# Altium footprint library IC.PcbLib: 54 footprints (part 1 of 4)
Each footprint in its own frame and in the unit in brackets; x right, y up, seen from the top. Pads: shape width x height; smd on the part's side, far side on the other; paste and mask are expansions set on the pad; w line width, h text height; cw(c..) or ccw(c..) is an arc to the next point about the centre after c.
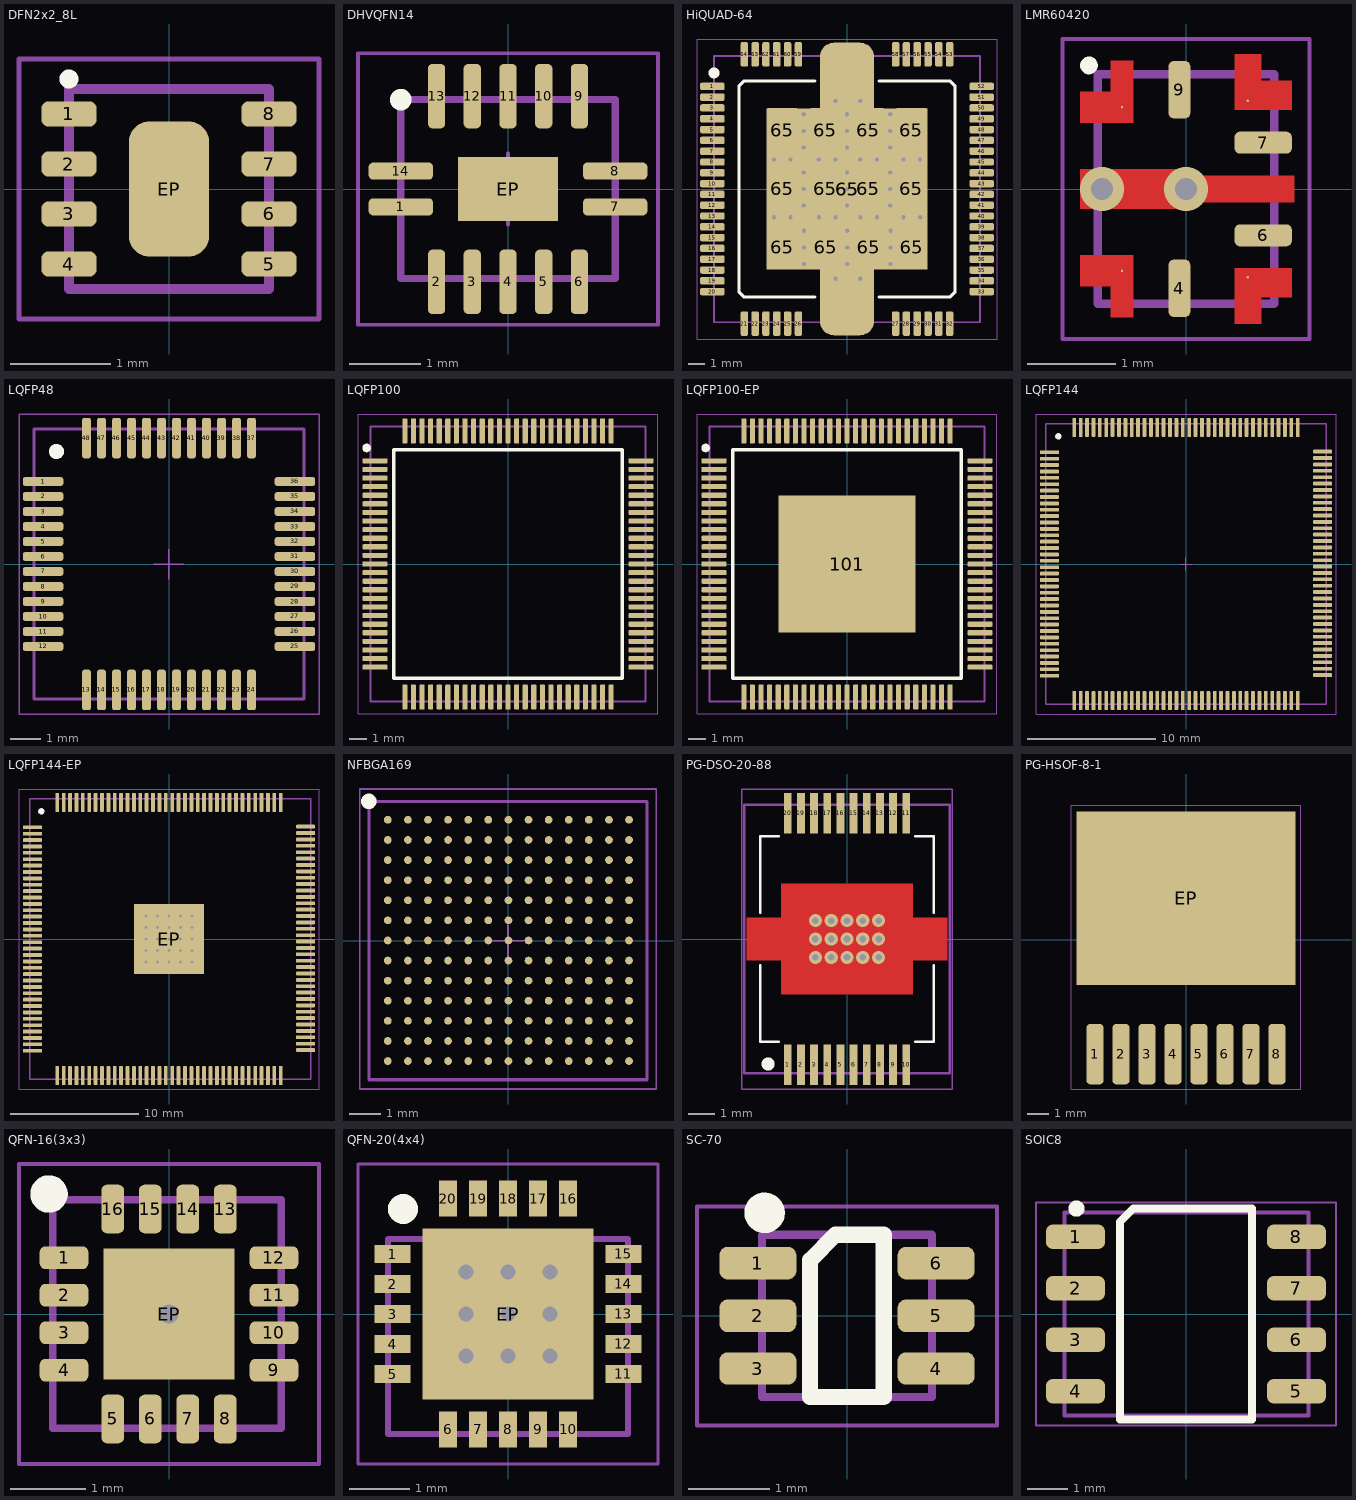
[diagram p0: the footprints below, top view; thin cyan lines are the x and y axes]

## DFN2x2_8L [mm] "2x2mm"
height 0.8
pads (9):
  rrect50% 0.55x0.25 smd: 1(-1,0.75) 2(-1,0.25) 3(-1,-0.25) 4(-1,-0.75) 5(1,-0.75) 6(1,-0.25) 7(1,0.25) 8(1,0.75)
  rrect50% 0.8x1.35 smd: EP(0,0)
Top Overlay:
  circle w0.15: c-1,1.1 r0.02
Mechanical 13:
  lines w0.1: -1,-1 1,-1 1,1 -1,1 -1,-1
Mechanical 15:
  lines w0.05: -1.5,-1.3 1.5,-1.3 1.5,1.3 -1.5,1.3 -1.5,-1.3
3D body "DFN8_2x2.STEP": height 0.75, standoff 0, extent -1.005,-1 1.005,1

## DHVQFN14 [mm] "plastic, leadless dual in-line compatible thermal enhanced / very thin quad flat package; 14 terminals; 0.5 mm pitch; 2.5x3x1 mm body"
height 1
pads (15):
  rrect50% 0.9x0.24 smd: 1(-1.5,-0.25) 7(1.5,-0.25) 8(1.5,0.25) 14(-1.5,0.25)
  rrect50% 0.24x0.9 smd: 2(-1,-1.3) 3(-0.5,-1.3) 4(0,-1.3) 5(0.5,-1.3) 6(1,-1.3) 9(1,1.3) 10(0.5,1.3) 11(0,1.3) 12(-0.5,1.3) 13(-1,1.3)
  rect 1.4x0.9 smd paste-2539.97: EP(0,0)
Top Overlay:
  circle w0.2: c-1.501,1.251 r0.05
Top Paste:
  rectangle: -0.3,-0.2 0.3,0.2
Mechanical 13:
  lines w0.1: -1.501,-1.251 1.501,-1.251 1.501,1.251 -1.501,1.251 -1.501,-1.251
Mechanical 15:
  lines w0.05: -0.5,0 0.5,0 ; 0,-0.5 0,0.5 ; -2.1,-1.9 2.1,-1.9 2.1,1.9 -2.1,1.9 -2.1,-1.9
3D body "User Library-DHVQFN 14.STEP": height 0.85, standoff -0.02, extent -1.501,-1.251 1.501,1.251

## HiQUAD-64 [mm] "64-Pin HI-QUAD package"
height 2
pads (78):
  rrect50% 1.475x0.45 smd mask+0.05: 1(-8.1,6.175) 2(-8.1,5.525) 3(-8.1,4.875) 4(-8.1,4.225) 5(-8.1,3.575) 6(-8.1,2.925) 7(-8.1,2.275) 8(-8.1,1.625) 9(-8.1,0.975) 10(-8.1,0.325) 11(-8.1,-0.325) 12(-8.1,-0.975) 13(-8.1,-1.625) 14(-8.1,-2.275) 15(-8.1,-2.925) 16(-8.1,-3.575) 17(-8.1,-4.225) 18(-8.1,-4.875) 19(-8.1,-5.525) 20(-8.1,-6.175) 33(8.1,-6.175) 34(8.1,-5.525) 35(8.1,-4.875) 36(8.1,-4.225) 37(8.1,-3.575) 38(8.1,-2.925) 39(8.1,-2.275) 40(8.1,-1.625) 41(8.1,-0.975) 42(8.1,-0.325) 43(8.1,0.325) 44(8.1,0.975) 45(8.1,1.625) 46(8.1,2.275) 47(8.1,2.925) 48(8.1,3.575) 49(8.1,4.225) 50(8.1,4.875) 51(8.1,5.525) 52(8.1,6.175)
  rrect50% 0.45x1.475 smd mask+0.05: 21(-6.175,-8.1) 22(-5.525,-8.1) 23(-4.875,-8.1) 24(-4.225,-8.1) 25(-3.575,-8.1) 26(-2.925,-8.1) 27(2.925,-8.1) 28(3.575,-8.1) 29(4.225,-8.1) 30(4.875,-8.1) 31(5.525,-8.1) 32(6.175,-8.1) 53(6.175,8.1) 54(5.525,8.1) 55(4.875,8.1) 56(4.225,8.1) 57(3.575,8.1) 58(2.925,8.1) 59(-2.925,8.1) 60(-3.575,8.1) 61(-4.225,8.1) 62(-4.875,8.1) 63(-5.525,8.1) 64(-6.175,8.1)
  rect 1.8x2.7 smd paste-10: 65(-3.896,0.021) 65(-3.896,3.521) 65(-3.883,-3.493) 65(-1.304,0.021) 65(-1.304,3.521) 65(-1.291,-3.493) 65(1.287,0.021) 65(1.287,3.521) 65(1.301,-3.493) 65(3.879,0.021) 65(3.879,3.521) 65(3.892,-3.493)
  rect 9.7x9.7 smd paste-10 mask+0.102: 65(0,0)
  rrect50% 3.25x17.6 smd paste-10 mask+0.102: 65(0,0)
via 0,1 diameter 0.5 hole 0.25
via 0,-1 diameter 0.5 hole 0.25
via 0,3.5 diameter 0.5 hole 0.25
via 0,4.5 diameter 0.5 hole 0.25
via 0,2.5 diameter 0.5 hole 0.25
via 2.6,3.5 diameter 0.5 hole 0.25
via 2.6,4.5 diameter 0.5 hole 0.25
via 2.6,2.5 diameter 0.5 hole 0.25
via -2.6,3.5 diameter 0.5 hole 0.25
via -2.6,4.5 diameter 0.5 hole 0.25
via -2.6,2.5 diameter 0.5 hole 0.25
via -2.6,0 diameter 0.5 hole 0.25
via -2.6,1 diameter 0.5 hole 0.25
via -2.6,-1 diameter 0.5 hole 0.25
via 2.6,0 diameter 0.5 hole 0.25
via 2.6,1 diameter 0.5 hole 0.25
via 2.6,-1 diameter 0.5 hole 0.25
via 2.613,-3.514 diameter 0.5 hole 0.25
via 2.613,-2.514 diameter 0.5 hole 0.25
via 2.613,-4.514 diameter 0.5 hole 0.25
via 0.013,-3.514 diameter 0.5 hole 0.25
via 0.013,-2.514 diameter 0.5 hole 0.25
via 0.013,-4.514 diameter 0.5 hole 0.25
via -2.587,-3.514 diameter 0.5 hole 0.25
via -2.587,-2.514 diameter 0.5 hole 0.25
via -2.587,-4.514 diameter 0.5 hole 0.25
via -3.4,1.769 diameter 0.5 hole 0.25
via -4.4,1.769 diameter 0.5 hole 0.25
via -0.7,1.769 diameter 0.5 hole 0.25
via -1.7,1.769 diameter 0.5 hole 0.25
via 1.8,1.769 diameter 0.5 hole 0.25
via 0.8,1.769 diameter 0.5 hole 0.25
via 4.4,1.769 diameter 0.5 hole 0.25
via 3.4,1.769 diameter 0.5 hole 0.25
via -3.394,-1.698 diameter 0.5 hole 0.25
via -4.394,-1.698 diameter 0.5 hole 0.25
via -0.694,-1.698 diameter 0.5 hole 0.25
via -1.694,-1.698 diameter 0.5 hole 0.25
via 1.806,-1.698 diameter 0.5 hole 0.25
via 0.806,-1.698 diameter 0.5 hole 0.25
via 4.406,-1.698 diameter 0.5 hole 0.25
via 3.406,-1.698 diameter 0.5 hole 0.25
via -0.7,5.3 diameter 0.5 hole 0.25
via 0.8,5.3 diameter 0.5 hole 0.25
via -0.7,-5.4 diameter 0.5 hole 0.25
via 0.8,-5.4 diameter 0.5 hole 0.25
via 0,0 diameter 0.5 hole 0.25
Top Overlay:
  circle w0.325: c-8.001,6.985 r0.162
  lines w0.2: -1.95,-6.5 -6.175,-6.5 -6.5,-6.175 -6.5,6.175 -6.175,6.5 -1.95,6.5 ; 1.95,-6.5 6.175,-6.5 6.5,-6.175 6.5,6.175 6.175,6.5 1.95,6.5
Top Paste:
  rectangle: -4.7,2.1 -3,4.8
  rectangle: -4.7,-1.3 -3,1.4
  rectangle: -4.7,-4.7 -3,-2
  rectangle: -2.2,2.1 -0.5,4.8
  rectangle: -2.2,-1.3 -0.5,1.4
  rectangle: -2.2,-4.7 -0.5,-2
  rectangle: 0.4,2.1 2.1,4.8
  rectangle: 0.4,-1.3 2.1,1.4
  rectangle: 0.4,-4.7 2.1,-2
  rectangle: 3,2.1 4.7,4.8
  rectangle: 3,-1.3 4.7,1.4
  rectangle: 3,-4.7 4.7,-2
  region: 1.651,-6.015 1.651,-8.047 1.651,-8.122 1.622,-8.269 1.564,-8.408 1.481,-8.533 1.375,-8.639 1.25,-8.722 1.111,-8.78 0.964,-8.809 0.889,-8.809 -0.889,-8.809 -0.964,-8.809 -1.111,-8.78 -1.25,-8.722 -1.375,-8.639 -1.481,-8.533 -1.564,-8.408 -1.622,-8.269 -1.651,-8.122 -1.651,-8.047 -1.651,-6.015
  region: -1.651,6.015 -1.651,8.047 -1.651,8.122 -1.622,8.269 -1.564,8.408 -1.481,8.533 -1.375,8.639 -1.25,8.722 -1.111,8.78 -0.964,8.809 -0.889,8.809 0.889,8.809 0.964,8.809 1.111,8.78 1.25,8.722 1.375,8.639 1.481,8.533 1.564,8.408 1.622,8.269 1.651,8.122 1.651,8.047 1.651,6.015
Top Solder:
  region: 1.778,-5.888 1.778,-8.047 1.778,-8.135 1.744,-8.306 1.677,-8.468 1.579,-8.614 1.456,-8.738 1.31,-8.835 1.148,-8.902 0.977,-8.936 0.889,-8.936 -0.889,-8.936 -0.977,-8.936 -1.148,-8.902 -1.31,-8.835 -1.456,-8.738 -1.58,-8.614 -1.677,-8.468 -1.744,-8.306 -1.778,-8.134 -1.778,-8.047 -1.778,-5.888
  region: -1.778,5.888 -1.778,8.047 -1.778,8.135 -1.744,8.306 -1.677,8.468 -1.579,8.614 -1.456,8.738 -1.31,8.835 -1.148,8.902 -0.977,8.936 -0.889,8.936 0.889,8.936 0.977,8.936 1.148,8.902 1.31,8.835 1.456,8.738 1.58,8.614 1.677,8.468 1.744,8.306 1.778,8.134 1.778,8.047 1.778,5.888
Mechanical 13:
  lines w0.1: -8.005,-8.008 -8.005,8.001 8,8.001 8,-8.008 -8.005,-8.008
Mechanical 15:
  lines w0.05: -9.025,-9.025 9.025,-9.025 9.025,9.025 -9.025,9.025 -9.025,-9.025
3D body "HiQUAD-64X.stp": height 1.6, standoff 0.01, extent -8.005,-8.008 8.005,8.001

## LMR60420 [mm] "9-PowerWQFN 2.5X2mm"
height 0.8
pads (9):
  round 0.025 smd: 1(-0.725,0.927) 2(0,0) 3(-0.725,-0.927) 5(0.7,-1) 8(0.7,1)
  rrect50% 0.25x0.65 smd: 4(-0.075,-1.125) 9(-0.075,1.125)
  rrect50% 0.65x0.25 smd: 6(0.875,-0.525) 7(0.875,0.525)
via 0,0 diameter 0.5 hole 0.25
via -0.95,0 diameter 0.5 hole 0.25
Top Layer:
  region: 0.55,-1.525 0.85,-1.525 0.85,-1.225 1.2,-1.225 1.2,-0.9 0.55,-0.9
  region: 0.55,1.525 0.85,1.525 0.85,1.225 1.2,1.225 1.2,0.9 0.55,0.9
  region: -1.2,1.102 -0.85,1.102 -0.85,1.452 -0.6,1.452 -0.6,0.752 -1.2,0.752
  region: -1.2,-1.102 -0.85,-1.102 -0.85,-1.452 -0.6,-1.452 -0.6,-0.752 -1.2,-0.752
  region: -1.2,0.225 -1.2,-0.225 0.1,-0.225 0.175,-0.15 1.225,-0.15 1.225,0.15 0.15,0.15 0.075,0.225
Top Overlay:
  circle w0.1: c-1.1,1.4 r0.05
Mechanical 13:
  lines w0.1: -1,-1.3 1,-1.3 1,1.3 -1,1.3 -1,-1.3
Mechanical 15:
  lines w0.05: -1.4,-1.7 1.4,-1.7 1.4,1.7 -1.4,1.7 -1.4,-1.7
3D body "RAK0009A.stp": height 0.8, standoff 0, extent -0.998,-1.205 1.002,1.295

## LQFP48 [mm] "48 Pin, Body 7x7x1.4"
height 1.4
pads (48):
  rrect50% 1.35x0.29 smd: 1(-4.2,2.75) 2(-4.2,2.25) 3(-4.2,1.75) 4(-4.2,1.25) 5(-4.2,0.75) 6(-4.2,0.25) 7(-4.2,-0.25) 8(-4.2,-0.75) 9(-4.2,-1.25) 10(-4.2,-1.75) 11(-4.2,-2.25) 12(-4.2,-2.75) 25(4.2,-2.75) 26(4.2,-2.25) 27(4.2,-1.75) 28(4.2,-1.25) 29(4.2,-0.75) 30(4.2,-0.25) 31(4.2,0.25) 32(4.2,0.75) 33(4.2,1.25) 34(4.2,1.75) 35(4.2,2.25) 36(4.2,2.75)
  rrect50% 0.29x1.35 smd: 13(-2.75,-4.2) 14(-2.25,-4.2) 15(-1.75,-4.2) 16(-1.25,-4.2) 17(-0.75,-4.2) 18(-0.25,-4.2) 19(0.25,-4.2) 20(0.75,-4.2) 21(1.25,-4.2) 22(1.75,-4.2) 23(2.25,-4.2) 24(2.75,-4.2) 37(2.75,4.2) 38(2.25,4.2) 39(1.75,4.2) 40(1.25,4.2) 41(0.75,4.2) 42(0.25,4.2) 43(-0.25,4.2) 44(-0.75,4.2) 45(-1.25,4.2) 46(-1.75,4.2) 47(-2.25,4.2) 48(-2.75,4.2)
Top Overlay:
  circle w0.25: c-3.75,3.75 r0.125
Mechanical 13:
  lines w0.1: -4.5,-4.5 -4.5,4.5 4.5,4.5 4.5,-4.5 -4.5,-4.5
Mechanical 15:
  lines w0.05: -0.5,0 0.5,0 ; 0,-0.5 0,0.5 ; -5,-5 -5,5 5,5 5,-5 -5,-5
3D body "LQFP48.STEP": height 1.5, standoff 0, extent -4.513,-4.513 4.513,4.513

## LQFP100 [mm] "Plastic low profile quad flat package; 100 leads; 0.5 mm pitch, 14 mm x 14 mm x 1.4 mm body"
height 1.4
pads (100):
  rrect50% 1.475x0.3 smd mask+0.05: 1(-7.738,6) 2(-7.738,5.5) 3(-7.738,5) 4(-7.738,4.5) 5(-7.738,4) 6(-7.738,3.5) 7(-7.738,3) 8(-7.738,2.5) 9(-7.738,2) 10(-7.738,1.5) 11(-7.738,1) 12(-7.738,0.5) 13(-7.738,0) 14(-7.738,-0.5) 15(-7.738,-1) 16(-7.738,-1.5) 17(-7.738,-2) 18(-7.738,-2.5) 19(-7.738,-3) 20(-7.738,-3.5) 21(-7.738,-4) 22(-7.738,-4.5) 23(-7.738,-5) 24(-7.738,-5.5) 25(-7.738,-6) 51(7.738,-6) 52(7.738,-5.5) 53(7.738,-5) 54(7.738,-4.5) 55(7.738,-4) 56(7.738,-3.5) 57(7.738,-3) 58(7.738,-2.5) 59(7.738,-2) 60(7.738,-1.5) 61(7.738,-1) 62(7.738,-0.5) 63(7.738,0) 64(7.738,0.5) 65(7.738,1) 66(7.738,1.5) 67(7.738,2) 68(7.738,2.5) 69(7.738,3) 70(7.738,3.5) 71(7.738,4) 72(7.738,4.5) 73(7.738,5) 74(7.738,5.5) 75(7.738,6)
  rrect50% 0.3x1.475 smd mask+0.05: 26(-6,-7.738) 27(-5.5,-7.738) 28(-5,-7.738) 29(-4.5,-7.738) 30(-4,-7.738) 31(-3.5,-7.738) 32(-3,-7.738) 33(-2.5,-7.738) 34(-2,-7.738) 35(-1.5,-7.738) 36(-1,-7.738) 37(-0.5,-7.738) 38(0,-7.738) 39(0.5,-7.738) 40(1,-7.738) 41(1.5,-7.738) 42(2,-7.738) 43(2.5,-7.738) 44(3,-7.738) 45(3.5,-7.738) 46(4,-7.738) 47(4.5,-7.738) 48(5,-7.738) 49(5.5,-7.738) 50(6,-7.738) 76(6,7.738) 77(5.5,7.738) 78(5,7.738) 79(4.5,7.738) 80(4,7.738) 81(3.5,7.738) 82(3,7.738) 83(2.5,7.738) 84(2,7.738) 85(1.5,7.738) 86(1,7.738) 87(0.5,7.738) 88(0,7.738) 89(-0.5,7.738) 90(-1,7.738) 91(-1.5,7.738) 92(-2,7.738) 93(-2.5,7.738) 94(-3,7.738) 95(-3.5,7.738) 96(-4,7.738) 97(-4.5,7.738) 98(-5,7.738) 99(-5.5,7.738) 100(-6,7.738)
Top Overlay:
  circle w0.25: c-8.225,6.75 r0.125
  lines w0.2: -6.65,-6.65 6.65,-6.65 6.65,6.65 -6.65,6.65 -6.65,-6.65
Mechanical 13:
  lines w0.1: -8,-8 8,-8 8,8 -8,8 -8,-8
Mechanical 15:
  lines w0.05: -8.725,-8.725 8.725,-8.725 8.725,8.725 -8.725,8.725 -8.725,-8.725
3D body "ATSAME70N20A-ANT.stp": height 1.6, standoff 0, extent -8,-8 8,8

## LQFP100-EP [mm] "Plastic low profile quad flat package; 100 leads; 0.5 mm pitch, 14 mm x 14 mm x 1.4 mm body; 100-LQFP Exposed Pad"
height 1.4
pads (101):
  rrect50% 1.475x0.3 smd mask+0.05: 1(-7.738,6) 2(-7.738,5.5) 3(-7.738,5) 4(-7.738,4.5) 5(-7.738,4) 6(-7.738,3.5) 7(-7.738,3) 8(-7.738,2.5) 9(-7.738,2) 10(-7.738,1.5) 11(-7.738,1) 12(-7.738,0.5) 13(-7.738,0) 14(-7.738,-0.5) 15(-7.738,-1) 16(-7.738,-1.5) 17(-7.738,-2) 18(-7.738,-2.5) 19(-7.738,-3) 20(-7.738,-3.5) 21(-7.738,-4) 22(-7.738,-4.5) 23(-7.738,-5) 24(-7.738,-5.5) 25(-7.738,-6) 51(7.738,-6) 52(7.738,-5.5) 53(7.738,-5) 54(7.738,-4.5) 55(7.738,-4) 56(7.738,-3.5) 57(7.738,-3) 58(7.738,-2.5) 59(7.738,-2) 60(7.738,-1.5) 61(7.738,-1) 62(7.738,-0.5) 63(7.738,0) 64(7.738,0.5) 65(7.738,1) 66(7.738,1.5) 67(7.738,2) 68(7.738,2.5) 69(7.738,3) 70(7.738,3.5) 71(7.738,4) 72(7.738,4.5) 73(7.738,5) 74(7.738,5.5) 75(7.738,6)
  rrect50% 0.3x1.475 smd mask+0.05: 26(-6,-7.738) 27(-5.5,-7.738) 28(-5,-7.738) 29(-4.5,-7.738) 30(-4,-7.738) 31(-3.5,-7.738) 32(-3,-7.738) 33(-2.5,-7.738) 34(-2,-7.738) 35(-1.5,-7.738) 36(-1,-7.738) 37(-0.5,-7.738) 38(0,-7.738) 39(0.5,-7.738) 40(1,-7.738) 41(1.5,-7.738) 42(2,-7.738) 43(2.5,-7.738) 44(3,-7.738) 45(3.5,-7.738) 46(4,-7.738) 47(4.5,-7.738) 48(5,-7.738) 49(5.5,-7.738) 50(6,-7.738) 76(6,7.738) 77(5.5,7.738) 78(5,7.738) 79(4.5,7.738) 80(4,7.738) 81(3.5,7.738) 82(3,7.738) 83(2.5,7.738) 84(2,7.738) 85(1.5,7.738) 86(1,7.738) 87(0.5,7.738) 88(0,7.738) 89(-0.5,7.738) 90(-1,7.738) 91(-1.5,7.738) 92(-2,7.738) 93(-2.5,7.738) 94(-3,7.738) 95(-3.5,7.738) 96(-4,7.738) 97(-4.5,7.738) 98(-5,7.738) 99(-5.5,7.738) 100(-6,7.738)
  rect 7.95x7.95 smd paste-10 mask+0.102: 101(0,0)
Top Overlay:
  circle w0.25: c-8.225,6.75 r0.125
  lines w0.2: -6.65,-6.65 6.65,-6.65 6.65,6.65 -6.65,6.65 -6.65,-6.65
Top Paste:
  rectangle: -3.975,-3.975 -2.705,-2.705
  rectangle: -2.305,-3.975 -1.035,-2.705
  rectangle: -0.635,-3.975 0.635,-2.705
  rectangle: 1.035,-3.975 2.305,-2.705
  rectangle: 2.705,-3.975 3.975,-2.705
  region: -2.705,-2.305 -2.705,-1.035 -3.975,-1.035 -3.975,-2.305
  region: -1.035,-2.305 -1.035,-1.035 -2.305,-1.035 -2.305,-2.305
  region: 0.635,-2.305 0.635,-1.035 -0.635,-1.035 -0.635,-2.305
  region: 2.305,-2.305 2.305,-1.035 1.035,-1.035 1.035,-2.305
  region: 3.975,-2.305 3.975,-1.035 2.705,-1.035 2.705,-2.305
  region: -2.705,-0.635 -2.705,0.635 -3.975,0.635 -3.975,-0.635
  region: -1.035,-0.635 -1.035,0.635 -2.305,0.635 -2.305,-0.635
  region: 0.635,-0.635 0.635,0.635 -0.635,0.635 -0.635,-0.635
  region: 2.305,-0.635 2.305,0.635 1.035,0.635 1.035,-0.635
  region: 3.975,-0.634 3.975,0.636 2.705,0.636 2.705,-0.634
  region: -2.705,1.035 -2.705,2.305 -3.975,2.305 -3.975,1.035
  region: -1.035,1.035 -1.035,2.305 -2.305,2.305 -2.305,1.035
  region: 0.635,1.035 0.635,2.305 -0.635,2.305 -0.635,1.035
  region: 2.305,1.036 2.305,2.306 1.035,2.306 1.035,1.036
  region: 3.975,1.036 3.975,2.306 2.705,2.306 2.705,1.036
  region: -2.705,2.705 -2.705,3.975 -3.975,3.975 -3.975,2.705
  region: -1.035,2.705 -1.035,3.975 -2.305,3.975 -2.305,2.705
  region: 0.635,2.706 0.635,3.976 -0.635,3.976 -0.635,2.706
  region: 2.305,2.706 2.305,3.976 1.035,3.976 1.035,2.706
  region: 3.975,2.706 3.975,3.976 2.705,3.976 2.705,2.706
Top Solder:
  rectangle: 2.705,-3.975 3.975,-2.705
  rectangle: -3.975,-3.975 -2.705,-2.705
  rectangle: -2.305,-3.975 -1.035,-2.705
  rectangle: -0.635,-3.975 0.635,-2.705
  rectangle: 1.035,-3.975 2.305,-2.705
  region: -2.705,-2.305 -2.705,-1.035 -3.975,-1.035 -3.975,-2.305
  region: -1.035,-2.305 -1.035,-1.035 -2.305,-1.035 -2.305,-2.305
  region: 0.635,-2.305 0.635,-1.035 -0.635,-1.035 -0.635,-2.305
  region: 2.305,-2.305 2.305,-1.035 1.035,-1.035 1.035,-2.305
  region: 3.975,-2.305 3.975,-1.035 2.705,-1.035 2.705,-2.305
  region: -2.705,2.705 -2.705,3.975 -3.975,3.975 -3.975,2.705
  region: -1.035,2.705 -1.035,3.975 -2.305,3.975 -2.305,2.705
  region: 0.635,2.706 0.635,3.976 -0.635,3.976 -0.635,2.706
  region: 2.305,2.706 2.305,3.976 1.035,3.976 1.035,2.706
  region: 3.975,2.706 3.975,3.976 2.705,3.976 2.705,2.706
  region: -2.705,-0.635 -2.705,0.635 -3.975,0.635 -3.975,-0.635
  region: -1.035,-0.635 -1.035,0.635 -2.305,0.635 -2.305,-0.635
  region: 0.635,-0.635 0.635,0.635 -0.635,0.635 -0.635,-0.635
  region: 2.305,-0.635 2.305,0.635 1.035,0.635 1.035,-0.635
  region: 3.975,-0.634 3.975,0.636 2.705,0.636 2.705,-0.634
  region: -2.705,1.035 -2.705,2.305 -3.975,2.305 -3.975,1.035
  region: -1.035,1.035 -1.035,2.305 -2.305,2.305 -2.305,1.035
  region: 0.635,1.035 0.635,2.305 -0.635,2.305 -0.635,1.035
  region: 2.305,1.036 2.305,2.306 1.035,2.306 1.035,1.036
  region: 3.975,1.036 3.975,2.306 2.705,2.306 2.705,1.036
Mechanical 13:
  lines w0.1: -8.001,-8.001 8.001,-8.001 8.001,8.001 -8.001,8.001 -8.001,-8.001
Mechanical 15:
  lines w0.05: -8.725,-8.725 8.725,-8.725 8.725,8.725 -8.725,8.725 -8.725,-8.725
3D body "LQFP100_14X14X1P4_EP7P6X7P6_STM.step": height 1.6, standoff 0, extent -8.001,-8.001 8.001,8.001

## LQFP144 [mm] "144-Lead Plastic Thin Quad Flat Pack, 20x20mm"
height 1
pads (144):
  rrect50% 1.5x0.3 smd: 1(-10.7,8.75) 2(-10.7,8.25) 3(-10.7,7.75) 4(-10.7,7.25) 5(-10.7,6.75) 6(-10.7,6.25) 7(-10.7,5.75) 8(-10.7,5.25) 9(-10.7,4.75) 10(-10.7,4.25) 11(-10.7,3.75) 12(-10.7,3.25) 13(-10.7,2.75) 14(-10.7,2.25) 15(-10.7,1.75) 16(-10.7,1.25) 17(-10.7,0.75) 18(-10.7,0.25) 19(-10.7,-0.25) 20(-10.7,-0.75) 21(-10.7,-1.25) 22(-10.7,-1.75) 23(-10.7,-2.25) 24(-10.7,-2.75) 25(-10.7,-3.25) 26(-10.7,-3.75) 27(-10.7,-4.25) 28(-10.7,-4.75) 29(-10.7,-5.25) 30(-10.7,-5.75) 31(-10.7,-6.25) 32(-10.7,-6.75) 33(-10.7,-7.25) 34(-10.7,-7.75) 35(-10.7,-8.25) 36(-10.7,-8.75) 73(10.7,-8.7) 74(10.7,-8.2) 75(10.7,-7.7) 76(10.7,-7.2) 77(10.7,-6.7) 78(10.7,-6.2) 79(10.7,-5.7) 80(10.7,-5.2) 81(10.7,-4.7) 82(10.7,-4.2) 83(10.7,-3.7) 84(10.7,-3.2) 85(10.7,-2.7) 86(10.7,-2.2) 87(10.7,-1.7) 88(10.7,-1.2) 89(10.7,-0.7) 90(10.7,-0.2) 91(10.7,0.3) 92(10.7,0.8) 93(10.7,1.3) 94(10.7,1.8) 95(10.7,2.3) 96(10.7,2.8) 97(10.7,3.3) 98(10.7,3.8) 99(10.7,4.3) 100(10.7,4.8) 101(10.7,5.3) 102(10.7,5.8) 103(10.7,6.3) 104(10.7,6.8) 105(10.7,7.3) 106(10.7,7.8) 107(10.7,8.3) 108(10.7,8.8)
  rrect50% 0.3x1.5 smd: 37(-8.75,-10.7) 38(-8.25,-10.7) 39(-7.75,-10.7) 40(-7.25,-10.7) 41(-6.75,-10.7) 42(-6.25,-10.7) 43(-5.75,-10.7) 44(-5.25,-10.7) 45(-4.75,-10.7) 46(-4.25,-10.7) 47(-3.75,-10.7) 48(-3.25,-10.7) 49(-2.75,-10.7) 50(-2.25,-10.7) 51(-1.75,-10.7) 52(-1.25,-10.7) 53(-0.75,-10.7) 54(-0.25,-10.7) 55(0.25,-10.7) 56(0.75,-10.7) 57(1.25,-10.7) 58(1.75,-10.7) 59(2.25,-10.7) 60(2.75,-10.7) 61(3.25,-10.7) 62(3.75,-10.7) 63(4.25,-10.7) 64(4.75,-10.7) 65(5.25,-10.7) 66(5.75,-10.7) 67(6.25,-10.7) 68(6.75,-10.7) 69(7.25,-10.7) 70(7.75,-10.7) 71(8.25,-10.7) 72(8.75,-10.7) 109(8.75,10.7) 110(8.25,10.7) 111(7.75,10.7) 112(7.25,10.7) 113(6.75,10.7) 114(6.25,10.7) 115(5.75,10.7) 116(5.25,10.7) 117(4.75,10.7) 118(4.25,10.7) 119(3.75,10.7) 120(3.25,10.7) 121(2.75,10.7) 122(2.25,10.7) 123(1.75,10.7) 124(1.25,10.7) 125(0.75,10.7) 126(0.25,10.7) 127(-0.25,10.7) 128(-0.75,10.7) 129(-1.25,10.7) 130(-1.75,10.7) 131(-2.25,10.7) 132(-2.75,10.7) 133(-3.25,10.7) 134(-3.75,10.7) 135(-4.25,10.7) 136(-4.75,10.7) 137(-5.25,10.7) 138(-5.75,10.7) 139(-6.25,10.7) 140(-6.75,10.7) 141(-7.25,10.7) 142(-7.75,10.7) 143(-8.25,10.7) 144(-8.75,10.7)
Top Overlay:
  circle w0.25: c-10,10 r0.125
Mechanical 13:
  lines w0.1: -11,-11 -11,11 11,11 11,-11 -11,-11
Mechanical 15:
  lines w0.05: -0.5,0 0.5,0 ; 0,-0.5 0,0.5 ; -11.75,-11.75 -11.75,11.75 11.75,11.75 11.75,-11.75 -11.75,-11.75
3D body "LQFP-144pin.SLDPRT": height 1.65, standoff 0.05, extent -11,-11 11,11

## LQFP144-EP [mm] "144-Lead Plastic Thin Quad Flat Pack with epad, 20x20mm"
height 1
pads (145):
  rrect50% 1.5x0.3 smd: 1(-10.7,8.75) 2(-10.7,8.25) 3(-10.7,7.75) 4(-10.7,7.25) 5(-10.7,6.75) 6(-10.7,6.25) 7(-10.7,5.75) 8(-10.7,5.25) 9(-10.7,4.75) 10(-10.7,4.25) 11(-10.7,3.75) 12(-10.7,3.25) 13(-10.7,2.75) 14(-10.7,2.25) 15(-10.7,1.75) 16(-10.7,1.25) 17(-10.7,0.75) 18(-10.7,0.25) 19(-10.7,-0.25) 20(-10.7,-0.75) 21(-10.7,-1.25) 22(-10.7,-1.75) 23(-10.7,-2.25) 24(-10.7,-2.75) 25(-10.7,-3.25) 26(-10.7,-3.75) 27(-10.7,-4.25) 28(-10.7,-4.75) 29(-10.7,-5.25) 30(-10.7,-5.75) 31(-10.7,-6.25) 32(-10.7,-6.75) 33(-10.7,-7.25) 34(-10.7,-7.75) 35(-10.7,-8.25) 36(-10.7,-8.75) 73(10.7,-8.7) 74(10.7,-8.2) 75(10.7,-7.7) 76(10.7,-7.2) 77(10.7,-6.7) 78(10.7,-6.2) 79(10.7,-5.7) 80(10.7,-5.2) 81(10.7,-4.7) 82(10.7,-4.2) 83(10.7,-3.7) 84(10.7,-3.2) 85(10.7,-2.7) 86(10.7,-2.2) 87(10.7,-1.7) 88(10.7,-1.2) 89(10.7,-0.7) 90(10.7,-0.2) 91(10.7,0.3) 92(10.7,0.8) 93(10.7,1.3) 94(10.7,1.8) 95(10.7,2.3) 96(10.7,2.8) 97(10.7,3.3) 98(10.7,3.8) 99(10.7,4.3) 100(10.7,4.8) 101(10.7,5.3) 102(10.7,5.8) 103(10.7,6.3) 104(10.7,6.8) 105(10.7,7.3) 106(10.7,7.8) 107(10.7,8.3) 108(10.7,8.8)
  rrect50% 0.3x1.5 smd: 37(-8.75,-10.7) 38(-8.25,-10.7) 39(-7.75,-10.7) 40(-7.25,-10.7) 41(-6.75,-10.7) 42(-6.25,-10.7) 43(-5.75,-10.7) 44(-5.25,-10.7) 45(-4.75,-10.7) 46(-4.25,-10.7) 47(-3.75,-10.7) 48(-3.25,-10.7) 49(-2.75,-10.7) 50(-2.25,-10.7) 51(-1.75,-10.7) 52(-1.25,-10.7) 53(-0.75,-10.7) 54(-0.25,-10.7) 55(0.25,-10.7) 56(0.75,-10.7) 57(1.25,-10.7) 58(1.75,-10.7) 59(2.25,-10.7) 60(2.75,-10.7) 61(3.25,-10.7) 62(3.75,-10.7) 63(4.25,-10.7) 64(4.75,-10.7) 65(5.25,-10.7) 66(5.75,-10.7) 67(6.25,-10.7) 68(6.75,-10.7) 69(7.25,-10.7) 70(7.75,-10.7) 71(8.25,-10.7) 72(8.75,-10.7) 109(8.75,10.7) 110(8.25,10.7) 111(7.75,10.7) 112(7.25,10.7) 113(6.75,10.7) 114(6.25,10.7) 115(5.75,10.7) 116(5.25,10.7) 117(4.75,10.7) 118(4.25,10.7) 119(3.75,10.7) 120(3.25,10.7) 121(2.75,10.7) 122(2.25,10.7) 123(1.75,10.7) 124(1.25,10.7) 125(0.75,10.7) 126(0.25,10.7) 127(-0.25,10.7) 128(-0.75,10.7) 129(-1.25,10.7) 130(-1.75,10.7) 131(-2.25,10.7) 132(-2.75,10.7) 133(-3.25,10.7) 134(-3.75,10.7) 135(-4.25,10.7) 136(-4.75,10.7) 137(-5.25,10.7) 138(-5.75,10.7) 139(-6.25,10.7) 140(-6.75,10.7) 141(-7.25,10.7) 142(-7.75,10.7) 143(-8.25,10.7) 144(-8.75,10.7)
  rect 5.5x5.5 smd: EP(0,0)
via 1.8,-1.8 diameter 0.5 hole 0.25
via 1.8,-0.9 diameter 0.5 hole 0.25
via 1.8,0 diameter 0.5 hole 0.25
via 1.8,1.8 diameter 0.5 hole 0.25
via 1.8,0.9 diameter 0.5 hole 0.25
via 0.9,-1.8 diameter 0.5 hole 0.25
via 0.9,-0.9 diameter 0.5 hole 0.25
via 0.9,0 diameter 0.5 hole 0.25
via 0.9,1.8 diameter 0.5 hole 0.25
via 0.9,0.9 diameter 0.5 hole 0.25
via 0,-1.8 diameter 0.5 hole 0.25
via 0,-0.9 diameter 0.5 hole 0.25
via 0.007,0.003 diameter 0.5 hole 0.25
via 0,1.8 diameter 0.5 hole 0.25
via 0,0.9 diameter 0.5 hole 0.25
via -0.9,-1.8 diameter 0.5 hole 0.25
via -0.9,-0.9 diameter 0.5 hole 0.25
via -0.9,0 diameter 0.5 hole 0.25
via -0.9,1.8 diameter 0.5 hole 0.25
via -0.9,0.9 diameter 0.5 hole 0.25
via -1.8,-1.8 diameter 0.5 hole 0.25
via -1.8,-0.9 diameter 0.5 hole 0.25
via -1.8,0 diameter 0.5 hole 0.25
via -1.8,1.8 diameter 0.5 hole 0.25
via -1.8,0.9 diameter 0.5 hole 0.25
Top Overlay:
  circle w0.25: c-10,10 r0.125
Mechanical 13:
  lines w0.1: -10.9,-11 11.1,-11 11.1,11 -10.9,11 -10.9,-11
Mechanical 15:
  lines w0.05: -0.5,0 0.5,0 ; 0,-0.5 0,0.5 ; -11.75,-11.75 11.75,-11.75 11.75,11.75 -11.75,11.75 -11.75,-11.75
3D body "LQFP-144pin.SLDPRT": height 1.65, standoff 0.05, extent -10.9,-11 11.1,11

## NFBGA169 [mm] "9x9mm"
height 1
pads (169):
  round 0.25 smd: A1(-3.887,3.903) A2(-3.237,3.903) A3(-2.587,3.903) A4(-1.937,3.903) A5(-1.287,3.903) A6(-0.637,3.903) A7(0.013,3.903) A8(0.663,3.903) A9(1.313,3.903) A10(1.963,3.903) A11(2.613,3.903) A12(3.263,3.903) A13(3.913,3.903) B1(-3.887,3.253) B2(-3.237,3.253) B3(-2.587,3.253) B4(-1.937,3.253) B5(-1.287,3.253) B6(-0.637,3.253) B7(0.013,3.253) B8(0.663,3.253) B9(1.313,3.253) B10(1.963,3.253) B11(2.613,3.253) B12(3.263,3.253) B13(3.913,3.253) C1(-3.887,2.603) C2(-3.237,2.603) C3(-2.587,2.603) C4(-1.937,2.603) C5(-1.287,2.603) C6(-0.637,2.603) C7(0.013,2.603) C8(0.663,2.603) C9(1.313,2.603) C10(1.963,2.603) C11(2.613,2.603) C12(3.263,2.603) C13(3.913,2.603) D1(-3.887,1.953) D2(-3.237,1.953) D3(-2.587,1.953) D4(-1.937,1.953) D5(-1.287,1.953) D6(-0.637,1.953) D7(0.013,1.953) D8(0.663,1.953) D9(1.313,1.953) D10(1.963,1.953) D11(2.613,1.953) D12(3.263,1.953) D13(3.913,1.953) E1(-3.887,1.303) E2(-3.237,1.303) E3(-2.587,1.303) E4(-1.937,1.303) E5(-1.287,1.303) E6(-0.637,1.303) E7(0.013,1.303) E8(0.663,1.303) E9(1.313,1.303) E10(1.963,1.303) E11(2.613,1.303) E12(3.263,1.303) E13(3.913,1.303) F1(-3.887,0.653) F2(-3.237,0.653) F3(-2.587,0.653) F4(-1.937,0.653) F5(-1.287,0.653) F6(-0.637,0.653) F7(0.013,0.653) F8(0.663,0.653) F9(1.313,0.653) F10(1.963,0.653) F11(2.613,0.653) F12(3.263,0.653) F13(3.913,0.653) G1(-3.887,0.003) G2(-3.237,0.003) G3(-2.587,0.003) G4(-1.937,0.003) G5(-1.287,0.003) G6(-0.637,0.003) G7(0.013,0.003) G8(0.663,0.003) G9(1.313,0.003) G10(1.963,0.003) G11(2.613,0.003) G12(3.263,0.003) G13(3.913,0.003) H1(-3.887,-0.647) H2(-3.237,-0.647) H3(-2.587,-0.647) H4(-1.937,-0.647) H5(-1.287,-0.647) H6(-0.637,-0.647) H7(0.013,-0.647) H8(0.663,-0.647) H9(1.313,-0.647) H10(1.963,-0.647) H11(2.613,-0.647) H12(3.263,-0.647) H13(3.913,-0.647) J1(-3.887,-1.297) J2(-3.237,-1.297) J3(-2.587,-1.297) J4(-1.937,-1.297) J5(-1.287,-1.297) J6(-0.637,-1.297) J7(0.013,-1.297) J8(0.663,-1.297) J9(1.313,-1.297) J10(1.963,-1.297) J11(2.613,-1.297) J12(3.263,-1.297) J13(3.913,-1.297) K1(-3.887,-1.947) K2(-3.237,-1.947) K3(-2.587,-1.947) K4(-1.937,-1.947) K5(-1.287,-1.947) K6(-0.637,-1.947) K7(0.013,-1.947) K8(0.663,-1.947) K9(1.313,-1.947) K10(1.963,-1.947) K11(2.613,-1.947) K12(3.263,-1.947) K13(3.913,-1.947) L1(-3.887,-2.597) L2(-3.237,-2.597) L3(-2.587,-2.597) L4(-1.937,-2.597) L5(-1.287,-2.597) L6(-0.637,-2.597) L7(0.013,-2.597) L8(0.663,-2.597) L9(1.313,-2.597) L10(1.963,-2.597) L11(2.613,-2.597) L12(3.263,-2.597) L13(3.913,-2.597) M1(-3.887,-3.247) M2(-3.237,-3.247) M3(-2.587,-3.247) M4(-1.937,-3.247) M5(-1.287,-3.247) M6(-0.637,-3.247) M7(0.013,-3.247) M8(0.663,-3.247) M9(1.313,-3.247) M10(1.963,-3.247) M11(2.613,-3.247) M12(3.263,-3.247) M13(3.913,-3.247) N1(-3.887,-3.897) N2(-3.237,-3.897) N3(-2.587,-3.897) N4(-1.937,-3.897) N5(-1.287,-3.897) N6(-0.637,-3.897) N7(0.013,-3.897) N8(0.663,-3.897) N9(1.313,-3.897) N10(1.963,-3.897) N11(2.613,-3.897) N12(3.263,-3.897) N13(3.913,-3.897)
Top Overlay:
  circle w0.25: c-4.5,4.5 r0.125
Mechanical 13:
  lines w0.1: -4.5,-4.5 4.5,-4.5 4.5,4.5 -4.5,4.5 -4.5,-4.5
Mechanical 15:
  lines w0.05: -0.5,0 0.5,0 ; 0,-0.5 0,0.5 ; -4.8,-4.8 4.8,-4.8 4.8,4.9 -4.8,4.9 -4.8,-4.8
3D body "NMR0169A.stp": height 1, standoff 0, extent -4.5,-4.5 4.5,4.5

## PG-DSO-20-88 [mm] "7.8 L x 7.5 mm"
height 2.6
pads (21):
  rect 0.3x1.55 smd paste-2539.97: 1(-2.25,-4.775) 2(-1.75,-4.775) 3(-1.25,-4.775) 4(-0.75,-4.775) 5(-0.25,-4.775) 6(0.25,-4.775) 7(0.75,-4.775) 8(1.25,-4.775) 9(1.75,-4.775) 10(2.25,-4.775) 11(2.25,4.775) 12(1.75,4.775) 13(1.25,4.775) 14(0.75,4.775) 15(0.25,4.775) 16(-0.25,4.775) 17(-0.75,4.775) 18(-1.25,4.775) 19(-1.75,4.775) 20(-2.25,4.775)
  round 0.025 smd paste-100: EP(0,0)
via -1.2,0 diameter 0.5 hole 0.25
via 1.2,0 diameter 0.5 hole 0.25
via 0,0.7 diameter 0.5 hole 0.25
via -1.2,0.7 diameter 0.5 hole 0.25
via 0.6,0.7 diameter 0.5 hole 0.25
via 1.2,0.7 diameter 0.5 hole 0.25
via -0.6,0.7 diameter 0.5 hole 0.25
via -1.2,-0.7 diameter 0.5 hole 0.25
via -0.6,-0.7 diameter 0.5 hole 0.25
via 0,-0.7 diameter 0.5 hole 0.25
via 0.6,-0.7 diameter 0.5 hole 0.25
via 1.2,-0.7 diameter 0.5 hole 0.25
via -0.6,0 diameter 0.5 hole 0.25
via 0,0 diameter 0.5 hole 0.25
via 0.6,0 diameter 0.5 hole 0.25
Top Layer:
  region: -3.8,-0.8 -3.8,0.8 -2.5,0.8 -2.5,2.1 2.5,2.1 2.5,0.8 3.8,0.8 3.8,-0.8 2.5,-0.8 2.5,-2.1 -2.5,-2.1 -2.5,-0.8
Top Overlay:
  circle w0.25: c-3,-4.75 r0.125
  lines w0.1: -3.3,-1 -3.3,-3.9 -2.6,-3.9 ; -3.3,1 -3.3,3.9 -2.6,3.9 ; 2.6,-3.9 3.3,-3.9 3.3,-1 ; 2.6,3.9 3.3,3.9 3.3,1
Top Paste:
  rectangle: 0.1,0.8 2.3,1.8
  rectangle: -2.3,0.8 -0.1,1.8
  rectangle: 0.1,-1.8 2.3,-0.8
  rectangle: -2.3,-1.8 -0.1,-0.8
  rectangle: 1.3,-0.5 3.5,0.5
  rectangle: -3.5,-0.5 -1.3,0.5
  rectangle: -1.1,-0.5 1.1,0.5
  region: 1.62,-5.53 1.62,-4.02 1.88,-4.02 1.88,-5.53
  region: 1.12,-5.53 1.12,-4.02 1.38,-4.02 1.38,-5.53
  region: 0.62,-5.53 0.62,-4.02 0.88,-4.02 0.88,-5.53
  region: 0.12,-5.53 0.12,-4.02 0.38,-4.02 0.38,-5.53
  region: -0.38,-5.53 -0.38,-4.02 -0.12,-4.02 -0.12,-5.53
  region: -0.88,-5.53 -0.88,-4.02 -0.62,-4.02 -0.62,-5.53
  region: -1.38,-5.53 -1.38,-4.02 -1.12,-4.02 -1.12,-5.53
  region: -1.88,-5.53 -1.88,-4.02 -1.62,-4.02 -1.62,-5.53
  region: -2.38,-5.53 -2.38,-4.02 -2.12,-4.02 -2.12,-5.53
  region: -2.38,4.02 -2.38,5.53 -2.12,5.53 -2.12,4.02
  region: -1.88,4.02 -1.88,5.53 -1.62,5.53 -1.62,4.02
  region: -1.38,4.02 -1.38,5.53 -1.12,5.53 -1.12,4.02
  region: -0.88,4.02 -0.88,5.53 -0.62,5.53 -0.62,4.02
  region: -0.38,4.02 -0.38,5.53 -0.12,5.53 -0.12,4.02
  region: 0.12,4.02 0.12,5.53 0.38,5.53 0.38,4.02
  region: 0.62,4.02 0.62,5.53 0.88,5.53 0.88,4.02
  region: 1.12,4.02 1.12,5.53 1.38,5.53 1.38,4.02
  region: 1.62,4.02 1.62,5.53 1.88,5.53 1.88,4.02
  region: 2.12,4.02 2.12,5.53 2.38,5.53 2.38,4.02
  region: 2.12,-5.53 2.12,-4.02 2.38,-4.02 2.38,-5.53
Mechanical 13:
  lines w0.1: -3.9,-5.1 3.9,-5.1 3.9,5.1 -3.9,5.1 -3.9,-5.1
Mechanical 15:
  lines w0.05: -0.25,0 0.25,0 ; 0,-0.25 0,0.25 ; -4,-5.7 -4,5.7 4,5.7 4,-5.7 -4,-5.7
3D body "IC_Infineon_TLE9104SHXUMA1_eec.STEP": height 0.25, standoff 0, extent -4,-5.65 4,5.65

## PG-HSOF-8-1 [mm] "PG-HSOF-8 (8-pin TO-Leadless) package 10X10mm"
height 2.3
pads (9):
  rrect50% 0.8x2.8 smd: 1(-4.2,-5.29) 2(-3,-5.29) 3(-1.8,-5.29) 4(-0.6,-5.29) 5(0.6,-5.29) 6(1.8,-5.29) 7(3,-5.29) 8(4.2,-5.29)
  rect 10.1x8 smd paste-100: EP(0,1.9)
Top Paste:
  region: 2.2,-1.4 1.2,-1.4 1.2,-0.9 3.2,-0.9 3.2,-1.4
  region: 2.2,-0.7 1.2,-0.7 1.2,-0.2 3.2,-0.2 3.2,-0.7
  region: 2.2,4.9 1.2,4.9 1.2,5.4 3.2,5.4 3.2,4.9
  region: 2.2,4.2 1.2,4.2 1.2,4.7 3.2,4.7 3.2,4.2
  region: 2.2,3.5 1.2,3.5 1.2,4 3.2,4 3.2,3.5
  region: 2.2,2.8 1.2,2.8 1.2,3.3 3.2,3.3 3.2,2.8
  region: 2.2,2.1 1.2,2.1 1.2,2.6 3.2,2.6 3.2,2.1
  region: 2.2,1.4 1.2,1.4 1.2,1.9 3.2,1.9 3.2,1.4
  region: 2.2,0.7 1.2,0.7 1.2,1.2 3.2,1.2 3.2,0.7
  region: 2.2,0 1.2,0 1.2,0.5 3.2,0.5 3.2,0
  region: -2.2,-1.4 -3.2,-1.4 -3.2,-0.9 -1.2,-0.9 -1.2,-1.4
  region: -2.2,-0.7 -3.2,-0.7 -3.2,-0.2 -1.2,-0.2 -1.2,-0.7
  region: -2.2,4.9 -3.2,4.9 -3.2,5.4 -1.2,5.4 -1.2,4.9
  region: -2.2,4.2 -3.2,4.2 -3.2,4.7 -1.2,4.7 -1.2,4.2
  region: -2.2,3.5 -3.2,3.5 -3.2,4 -1.2,4 -1.2,3.5
  region: -2.2,2.8 -3.2,2.8 -3.2,3.3 -1.2,3.3 -1.2,2.8
  region: -2.2,2.1 -3.2,2.1 -3.2,2.6 -1.2,2.6 -1.2,2.1
  region: -2.2,1.4 -3.2,1.4 -3.2,1.9 -1.2,1.9 -1.2,1.4
  region: -2.2,0.7 -3.2,0.7 -3.2,1.2 -1.2,1.2 -1.2,0.7
  region: -2.2,0 -3.2,0 -3.2,0.5 -1.2,0.5 -1.2,0
  region: 0,-1.4 -1,-1.4 -1,-0.9 1,-0.9 1,-1.4
  region: 0,-0.7 -1,-0.7 -1,-0.2 1,-0.2 1,-0.7
  region: 0,4.9 -1,4.9 -1,5.4 1,5.4 1,4.9
  region: 0,4.2 -1,4.2 -1,4.7 1,4.7 1,4.2
  region: 0,3.5 -1,3.5 -1,4 1,4 1,3.5
  region: 0,2.8 -1,2.8 -1,3.3 1,3.3 1,2.8
  region: 0,2.1 -1,2.1 -1,2.6 1,2.6 1,2.1
  region: 0,1.4 -1,1.4 -1,1.9 1,1.9 1,1.4
  region: 0,0.7 -1,0.7 -1,1.2 1,1.2 1,0.7
  region: 0,0 -1,0 -1,0.5 1,0.5 1,0
Mechanical 13:
  lines w0.1: -2,-2 -2,2 2,2 2,-2 -2,-2
Mechanical 15:
  lines w0.05: -0.5,0 0.5,0 ; 0,-0.5 0,0.5 ; -5.3,-6.9 -5.3,6.2 5.3,6.2 5.3,-6.9 -5.3,-6.9
3D body "https___www.infineon.com_assets_row_public_packages_73_3d_model_infineon-pg-hsof-8-1-3d-02-stp-package-en.stp": height 2.31, standoff 0, extent -4.95,-5.837 4.95,5.837

## QFN-16(3x3) [mm] "VQFN, 16-Leads, Body 3.5x3.5mm"
height 1
pads (17):
  rrect50% 0.65x0.3 smd: 1(-1.4,0.75) 2(-1.4,0.25) 3(-1.4,-0.25) 4(-1.4,-0.75) 9(1.4,-0.75) 10(1.4,-0.25) 11(1.4,0.25) 12(1.4,0.75)
  rrect50% 0.3x0.65 smd: 5(-0.75,-1.4) 6(-0.25,-1.4) 7(0.25,-1.4) 8(0.75,-1.4) 13(0.75,1.4) 14(0.25,1.4) 15(-0.25,1.4) 16(-0.75,1.4)
  rect 1.75x1.75 smd: EP(0,0)
via 0,0 diameter 0.5 hole 0.25
Top Overlay:
  circle w0.25: c-1.6,1.6 r0.125
Mechanical 13:
  lines w0.1: -1.55,-1.525 -1.55,1.525 1.5,1.525 1.5,-1.525 -1.55,-1.525
Mechanical 15:
  lines w0.05: -0.5,0 0.5,0 ; 0,-0.5 0,0.5 ; -2,-2 -2,2 2,2 2,-2 -2,-2
3D body "User Library-QFN-16_3x3.STEP": height 0.9, standoff 0, extent -1.545,-1.509 1.497,1.533

## QFN-20(4x4) [mm] "Plastic low profile quad flat package; 20Pin; 4X4mm"
height 0.8
pads (21):
  rect 0.6x0.3 smd: 1(-1.925,1) 2(-1.925,0.5) 3(-1.925,0) 4(-1.925,-0.5) 5(-1.925,-1) 11(1.925,-1) 12(1.925,-0.5) 13(1.925,0) 14(1.925,0.5) 15(1.925,1)
  rect 0.3x0.6 smd: 6(-1,-1.925) 7(-0.5,-1.925) 8(0,-1.925) 9(0.5,-1.925) 10(1,-1.925) 16(1,1.925) 17(0.5,1.925) 18(0,1.925) 19(-0.5,1.925) 20(-1,1.925)
  rect 2.85x2.85 smd: EP(0,0)
via 0,0 diameter 0.5 hole 0.25
via 0,0.7 diameter 0.5 hole 0.25
via 0.7,0.7 diameter 0.5 hole 0.25
via 0.7,0 diameter 0.5 hole 0.25
via -0.7,0 diameter 0.5 hole 0.25
via -0.7,0.7 diameter 0.5 hole 0.25
via -0.7,-0.7 diameter 0.5 hole 0.25
via 0,-0.7 diameter 0.5 hole 0.25
via 0.7,-0.7 diameter 0.5 hole 0.25
Top Overlay:
  circle w0.25: c-1.75,1.75 r0.125
Mechanical 13:
  lines w0.1: -2,-2 -2,1.25 2,1.25 2,-2 -2,-2
Mechanical 15:
  lines w0.05: -2.5,-2.5 -2.5,2.5 2.5,2.5 2.5,-2.5 -2.5,-2.5
3D body "User Library-qfn20-4x4.step": height 0.92, standoff 0, extent -2.019,-2.036 1.981,1.964

## SC-70 [mm] "6-Lead Thin Shrink Small Outline Transistor Package [SC70]  (KS-6)"
height 1
pads (6):
  rrect50% 0.95x0.4 smd mask+0.05: 1(-1.1,0.65) 2(-1.1,0) 3(-1.1,-0.65) 4(1.1,-0.65) 5(1.1,0) 6(1.1,0.65)
Top Overlay:
  circle w0.25: c-1.016,1.27 r0.125
  lines w0.2: -0.455,-1 0.454,-1 0.454,1 -0.143,1 -0.455,0.688 -0.455,-1
Mechanical 13:
  lines w0.1: -1.05,-1 1.05,-1 1.05,1 -1.05,1 -1.05,-1
Mechanical 15:
  lines w0.05: -1.85,-1.35 1.85,-1.35 1.85,1.35 -1.85,1.35 -1.85,-1.35
3D body "BC857CDW1T1G.stp": height 1.1, standoff 0, extent -1.05,-1 1.05,1

## SOIC8 [mm] "8-SOIC (0.154\", 3.90mm Width)"
height 1.75
pads (8):
  rrect50% 1.45x0.6 smd: 1(-2.725,1.905) 2(-2.725,0.635) 3(-2.725,-0.635) 4(-2.725,-1.905) 5(2.725,-1.905) 6(2.725,-0.635) 7(2.725,0.635) 8(2.725,1.905)
Top Overlay:
  circle w0.2: c-2.7,2.6 r0.1
  lines w0.2: -1.625,-2.6 -1.625,2.275 -1.3,2.6 1.625,2.6 1.625,-2.6 -1.625,-2.6
Mechanical 13:
  lines w0.1: -3,-2.5 3.025,-2.5 3.025,2.5 -3,2.5 -3,-2.5
Mechanical 15:
  lines w0.05: -3.7,-2.75 3.7,-2.75 3.7,2.75 -3.7,2.75 -3.7,-2.75
3D body "S08.stp": height 1.55, standoff 0, extent -2.975,-2.45 3.025,2.45